# Altium footprint library ICL_connectors_v1.PcbLib: 86 footprints (part 5 of 6)
Each footprint in its own frame and in the unit in brackets; x right, y up, seen from the top. Pads: shape width x height; smd on the part's side, far side on the other; paste and mask are expansions set on the pad; w line width, h text height; cw(c..) or ccw(c..) is an arc to the next point about the centre after c.
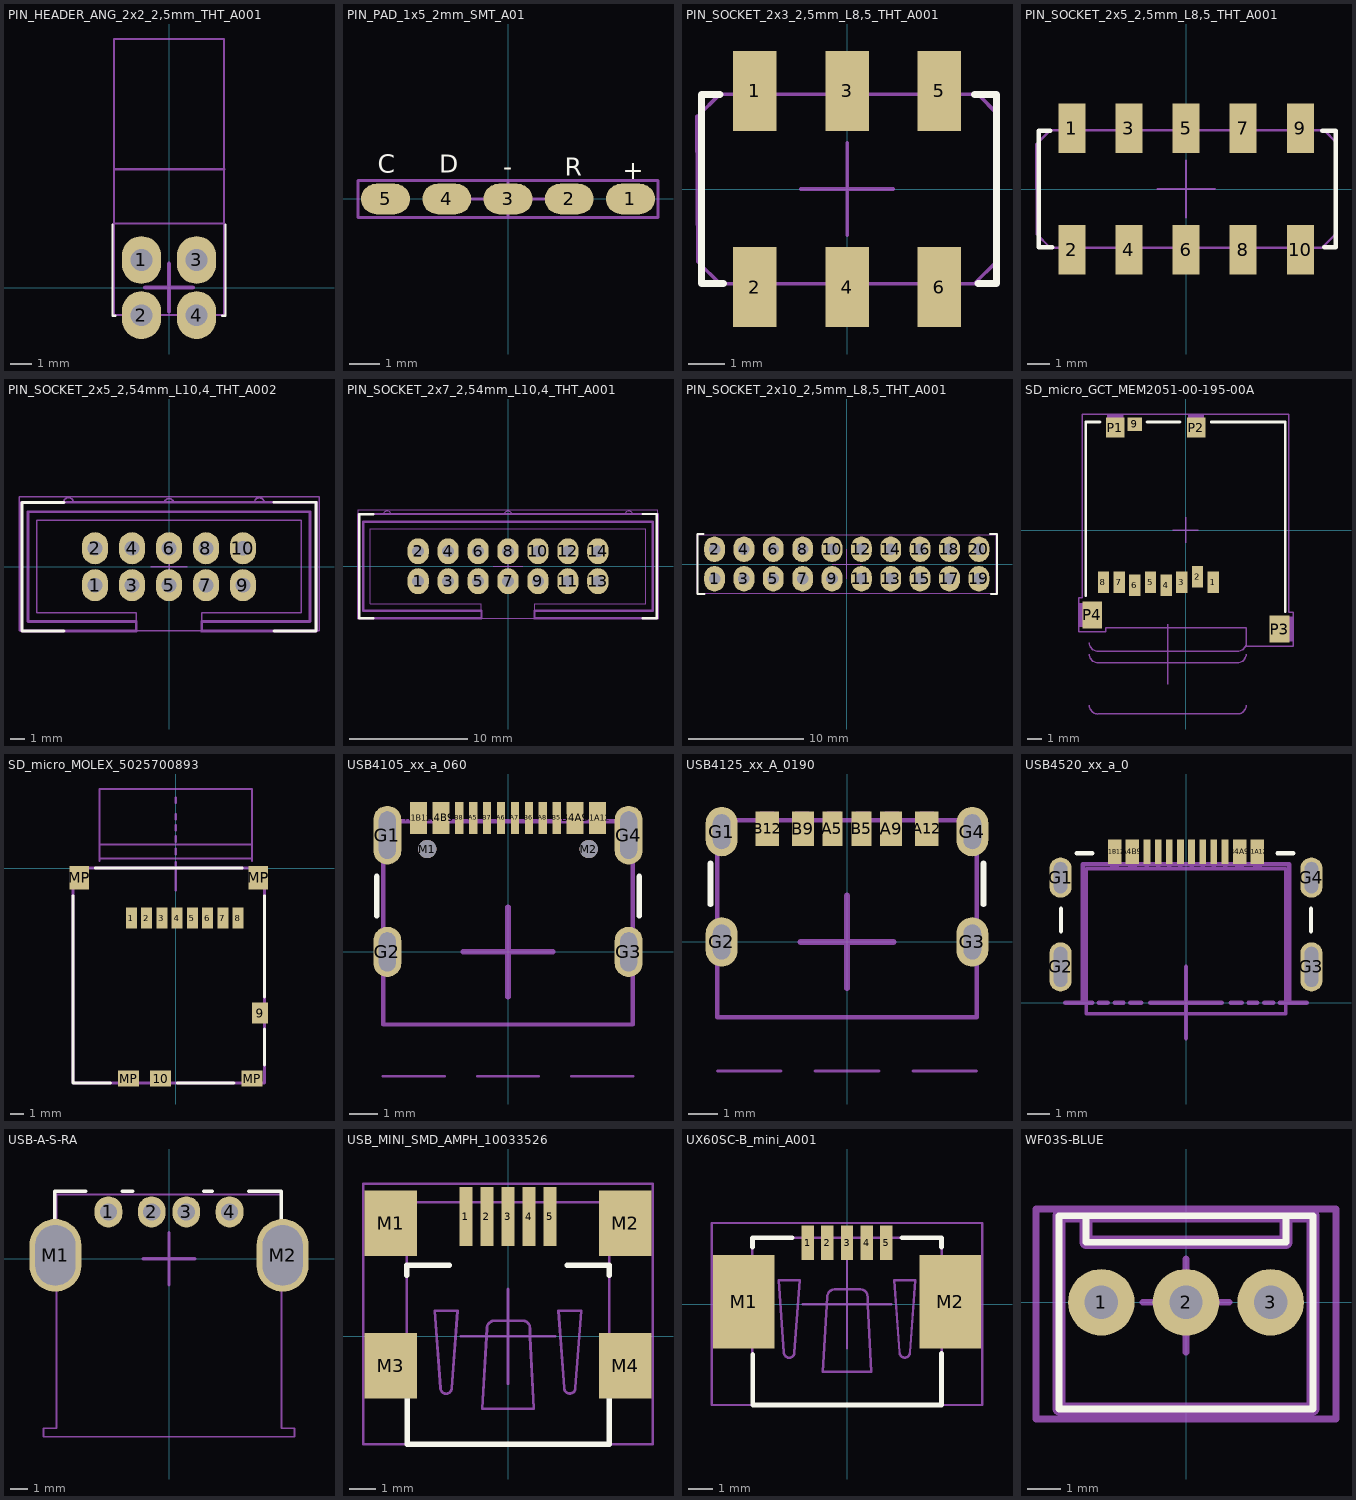
[diagram p4: the footprints below, top view; thin cyan lines are the x and y axes]

## PIN_HEADER_ANG_2x2_2,5mm_THT_A001 [mm]
pads (4):
  oval 1.8x2.2 hole 1 paste-1: 1(-1.27,1.27) 2(-1.27,-1.27) 3(1.27,1.27) 4(1.27,-1.27)
Top Overlay:
  lines w0.1: -2.6,2.9 -2.6,-1.3 -2.467,-1.3 ; 2.446,-1.298 2.446,-1.3 2.6,-1.3 2.6,2.9
Top M15-16_SORG:
  lines w0.2: -1.1,0 0,0 ; 0,-1.1 0,0 ; 0,1.1 0,0 ; 1.1,0 0,0
Top M17-18_TDES:
  text "'.Designator'" at -5.665,2.983 h1
Top M19-20_TMOT:
  lines w0.1: -2.551,2.95 2.537,2.95 ; -2.533,5.45 2.555,5.45 ; -2.54,-1.27 2.54,-1.27 2.54,11.45 -2.54,11.45 -2.54,-1.27
3D body "61300421021_2x2_2_54.stp": height 5.09, standoff -2.99, extent -2.545,-1.59 2.535,11.31

## PIN_PAD_1x5_2mm_SMT_A01 [mm] "programing pcb pad"
pads (5):
  oval 1.6x1 smd paste-2 mask+0.02: 1(4,0) 2(2,0) 3(0,0) 4(-2,0) 5(-4,0)
Top Overlay:
  text "+" at 3.75,0.65 h0.6
  text "-" at -0.15,0.75 h0.6
  text "R" at 1.85,0.75 h0.6
  text "D" at -2.25,0.85 h0.6
  text "C" at -4.25,0.85 h0.6
Top Solder:
  text "R" at 1.755,-1.429 h0.6
  text "-" at -0.2,-1.394 h0.6
  text "D" at -2.2,-1.394 h0.6
  text "C" at -4.245,-1.429 h0.6
  text "+" at 3.8,-1.4 h0.4
Top M11-12_SMOT:
  lines w0.1: -4.9,-0.6 4.9,-0.6 4.9,0.6 -4.9,0.6 -4.9,-0.6
Top M13-14_SDES:
  text "'.Designator'" at -2.832,0.892 h0.5
Top M15-16_SORG:
  lines w0.1: -1.27,0 0,0 ; 0,-0.6 0,0 ; 0,0.6 0,0 ; 1.27,0 0,0
3D body: height 0.2, standoff 0, extent -4.4,-0.4 -3.6,0.4
3D body: height 0.2, standoff 0, extent -2.4,-0.4 -1.6,0.4
3D body: height 0.2, standoff 0, extent -0.4,-0.4 0.4,0.4
3D body: height 0.2, standoff 0, extent 1.6,-0.4 2.4,0.4
3D body: height 0.2, standoff 0, extent 3.6,-0.4 4.4,0.4

## PIN_SOCKET_2x3_2,5mm_L8,5_THT_A001 [mm]
pads (6):
  rect 1.2x2.2 smd paste-1: 1(-2.54,2.7) 2(-2.54,-2.7) 3(0,2.7) 4(0,-2.7) 5(2.54,2.7) 6(2.54,-2.7)
Top Overlay:
  lines w0.2: -3.51,2.6 -4.01,2.6 -4.01,-2.6 -3.41,-2.6 ; 3.51,2.6 4.11,2.6 4.11,-2.6 3.61,-2.6
Top M11-12_SMOT:
  lines w0.1: -4.133,2 -4.11,-2 -3.502,-2.608 ; -4.11,2 -3.512,2.602 ; -3.515,2.608 3.61,2.608 ; -3.51,-2.608 3.502,-2.608 4.111,-1.999 ; 3.61,2.6 4.125,2.081 4.107,-2
Top M13-14_SDES:
  text "'.Designator'" at -5.665,-0.417 h1
Top M15-16_SORG:
  lines w0.1: -1.27,0 0,0 ; 0,-1.27 0,0 ; 0,1.27 0,0 ; 1.27,0 0,0
3D body "61030621821 (rev1).stp": height 7.46, standoff 0.01, extent -4.06,-3.35 4.06,3.35

## PIN_SOCKET_2x5_2,5mm_L8,5_THT_A001 [mm]
pads (10):
  rect 1.2x2.2 smd paste-1: 1(-5.08,2.7) 2(-5.08,-2.7) 3(-2.54,2.7) 4(-2.54,-2.7) 5(0,2.7) 6(0,-2.7) 7(2.54,2.7) 8(2.54,-2.7) 9(5.08,2.7) 10(5.08,-2.7)
Top Overlay:
  lines w0.2: -6.05,2.6 -6.55,2.6 -6.55,-2.6 -5.95,-2.6 ; 6.05,2.6 6.65,2.6 6.65,-2.6 6.15,-2.6
Top M11-12_SMOT:
  lines w0.1: -6.673,2 -6.65,-2 -6.042,-2.608 6.042,-2.608 6.651,-1.999 6.658,-0.59 ; -6.65,2 -6.052,2.602 ; -6.052,2.608 6.15,2.608 ; 6.15,2.6 6.665,2.081 6.653,-0.59
Top M13-14_SDES:
  text "'.Designator'" at -5.665,-0.417 h1
Top M15-16_SORG:
  lines w0.1: -1.27,0 0,0 ; 0,-1.27 0,0 ; 0,1.27 0,0 ; 1.27,0 0,0
3D body "61001021821_socket_2_54_2x5_SMT.stp": height 7.46, standoff 0.01, extent -6.6,-3.35 6.6,3.35

## PIN_SOCKET_2x5_2,54mm_L10,4_THT_A002 [mm]
pads (10):
  oval 1.8x2.2 hole 1 paste-1: 1(-5.08,-1.27) 2(-5.08,1.27) 3(-2.54,-1.27) 4(-2.54,1.27) 5(0,-1.27) 6(0,1.27) 7(2.54,-1.27) 8(2.54,1.27) 9(5.08,-1.27) 10(5.08,1.27)
Top Overlay:
  lines w0.2: -7.2,-4.425 -10.1,-4.425 -10.1,4.4 -7.2,4.4 ; 7.2,-4.4 10.1,-4.4 10.1,4.425 7.2,4.425
Top M15-16_SORG:
  lines w0.1: -1.27,0 0,0 ; 0,-1.27 0,0 ; 0,1.27 0,0 ; 1.27,0 0,0 ; -10.3,-4.4 10.3,-4.4 10.3,4.8 -10.3,4.8 -10.3,-4.4
Top M17-18_TDES:
  text "'.Designator'" at -5.665,5.583 h1
Top M19-20_TMOT:
  lines w0.1: -7.225,4.486 cw(c-6.9,4.4) -6.575,4.486 ; -2.25,-3.775 -2.25,-3.175 -9.07,-3.175 -9.07,3.175 9.07,3.175 9.07,-3.175 2.25,-3.175 2.25,-3.775 ; -0.325,4.425 cw(c0,4.339) 0.325,4.425 ; 5.875,4.486 cw(c6.2,4.4) 6.525,4.486
  lines w0.2: 2.25,-4.425 10.12,-4.425 10.12,4.425 -10.12,4.425 -10.12,-4.425 -2.25,-4.425 -2.25,-3.775 -9.67,-3.775 -9.67,3.775 9.67,3.775 9.67,-3.775 2.25,-3.775 2.25,-4.425 ; 2.25,-4.425 2.25,-4.425
3D body "61201021621 (rev1).stp": height 9.11, standoff -2.99, extent -10.18,-4.425 10.18,4.75

## PIN_SOCKET_2x7_2,54mm_L10,4_THT_A001 [mm]
pads (14):
  oval 1.8x2.2 hole 1 paste-1: 1(-7.62,-1.27) 2(-7.62,1.27) 3(-5.08,-1.27) 4(-5.08,1.27) 5(-2.54,-1.27) 6(-2.54,1.27) 7(0,-1.27) 8(0,1.27) 9(2.54,-1.27) 10(2.54,1.27) 11(5.08,-1.27) 12(5.08,1.27) 13(7.62,-1.27) 14(7.62,1.27)
Top Overlay:
  lines w0.2: -11.4,-4.425 -12.6,-4.425 -12.6,4.4 -11.4,4.4 ; 11.4,-4.4 12.6,-4.4 12.6,4.425 11.4,4.425
Top M15-16_SORG:
  lines w0.1: -1.27,0 0,0 ; 0,-1.27 0,0 ; 0,1.27 0,0 ; 1.27,0 0,0 ; -12.7,-4.4 12.7,-4.4 12.7,4.8 -12.7,4.8 -12.7,-4.4
Top M17-18_TDES:
  text "'.Designator'" at -5.665,5.583 h1
Top M19-20_TMOT:
  lines w0.1: -10.57,4.425 cw(c-10.245,4.339) -9.92,4.425 ; -2.25,-3.775 -2.25,-3.175 -11.67,-3.175 -11.67,3.175 11.67,3.175 11.67,-3.175 2.25,-3.175 2.25,-3.775 ; -0.325,4.425 cw(c0,4.339) 0.325,4.425 ; 9.92,4.425 cw(c10.245,4.339) 10.57,4.425
  lines w0.2: -12.72,4.425 -12.72,-4.425 -2.25,-4.425 -2.25,-3.775 -12.27,-3.775 -12.27,3.775 12.27,3.775 12.27,-3.775 2.25,-3.775 2.25,-4.425 ; -12.72,4.425 -12.72,4.425 ; -12.72,4.425 12.72,4.425 12.72,-4.425 2.25,-4.425 ; 2.25,-4.425 2.25,-4.425
3D body "61201421621 (rev1).stp": height 9.11, standoff -2.99, extent -12.72,-4.425 12.72,4.75

## PIN_SOCKET_2x10_2,5mm_L8,5_THT_A001 [mm]
pads (20):
  oval 1.8x2.2 hole 1 paste-1: 1(-11.43,-1.27) 2(-11.43,1.27) 3(-8.89,-1.27) 4(-8.89,1.27) 5(-6.35,-1.27) 6(-6.35,1.27) 7(-3.81,-1.27) 8(-3.81,1.27) 9(-1.27,-1.27) 10(-1.27,1.27) 11(1.27,-1.27) 12(1.27,1.27) 13(3.81,-1.27) 14(3.81,1.27) 15(6.35,-1.27) 16(6.35,1.27) 17(8.89,-1.27) 18(8.89,1.27) 19(11.43,-1.27) 20(11.43,1.27)
Top Overlay:
  lines w0.2: -12.4,2.6 -12.9,2.6 -12.9,-2.6 -12.3,-2.6 ; 12.4,2.6 13,2.6 13,-2.6 12.5,-2.6
Top M15-16_SORG:
  lines w0.1: -1.27,0 0,0 ; 0,-1.27 0,0 ; 0,1.27 0,0 ; 1.27,0 0,0
Top M17-18_TDES:
  text "'.Designator'" at -6.265,3.283 h1
Top M19-20_TMOT:
  lines w0.1: -12.95,-2.54 12.95,-2.54 12.95,2.54 -12.95,2.54 -12.95,-2.54
3D body "61302021821_PinHeaderSocket_2x10_2_54_v1.stp": height 8.41, standoff -3.14, extent -12.95,-2.54 12.95,2.54

## SD_micro_GCT_MEM2051-00-195-00A [mm] "MOLEX : 502570-0893"
pads (13):
  rect 0.8x1.5 smd: 1(1.94,-3.66) 2(0.84,-3.26) 3(-0.26,-3.66) 4(-1.36,-3.86) 5(-2.46,-3.66) 6(-3.56,-3.86) 7(-4.66,-3.66) 8(-5.76,-3.66)
  rect 1x0.95 smd: 9(-3.56,7.425)
  rect 1.3x1.4 smd: P1(-4.95,7.2) P2(0.75,7.2)
  rect 1.4x1.9 smd: P3(6.6,-6.95) P4(-6.55,-5.95)
Top Overlay:
  lines w0.2: -7,-4.6 -7,7.6 -6,7.6 ; -2.7,7.6 -0.4,7.6 ; 1.8,7.6 7,7.6 7,-5.7
Top M11-12_SMOT:
  rectangle: 1.6,-4.3 2.27,-3
  rectangle: 0.5,-3.9 1.17,-2.6
  rectangle: -0.6,-4.3 0.07,-3
  rectangle: -1.7,-4.5 -1.03,-3.2
  rectangle: -2.8,-4.3 -2.13,-3
  rectangle: -3.9,-4.5 -3.23,-3.2
  rectangle: -5,-4.3 -4.33,-3
  rectangle: -4.027,7 -3.128,7.851
  rectangle: 0.186,6.6 1.308,8.122
  rectangle: -6.1,-4.3 -5.43,-3
  rectangle: 6,-7.8 7.562,-6.073
  rectangle: -5.5,6.6 -4.351,8.14
  rectangle: -7.5,-6.8 -6,-5.1
  lines w0.1: -6.751,-12.305 ccw(c-6.151,-12.305) -6.151,-12.905 ; -6.751,-8.705 ccw(c-6.151,-8.705) -6.151,-9.305 ; -6.751,-7.905 ccw(c-6.151,-7.905) -6.151,-8.505 ; -6.151,-12.9 3.65,-12.9 ; -6.151,-9.3 3.65,-9.3 ; -6.151,-8.5 3.65,-8.5 ; -1.25,-10.8 -1.25,-6.6 ; 3.65,-12.901 ccw(c3.65,-12.301) 4.25,-12.301 ; 3.65,-9.301 ccw(c3.65,-8.701) 4.25,-8.701 ; 3.65,-8.501 ccw(c3.65,-7.901) 4.25,-7.901 ; -7.5,-7.15 -7.5,-4.75 -7.25,-4.75 -7.25,8.15 7.25,8.15 7.25,-5.75 7.55,-5.75 7.55,-8.15 4.25,-8.15 4.25,-6.85 -5.6,-6.85 -5.6,-7.15 -7.5,-7.15
Top M13-14_SDES:
  text "'.Designator'" at -5.765,1.283 h1
Top M15-16_SORG:
  lines w0.1: -0.9,0 0,0 ; 0,-0.9 0,0 ; 0,0.9 0,0 ; 0.9,0 0,0
3D body "step_temp.STEP": height 1.95, standoff 0, extent -7.05,-7.6 7.05,7.7

## SD_micro_MOLEX_5025700893 [mm] "MOLEX : 502570-0893"
pads (14):
  rect 0.8x1.5 smd: 1(-3.2,-3.6) 2(-2.1,-3.6) 3(-1,-3.6) 4(0.1,-3.6) 5(1.2,-3.6) 6(2.3,-3.6) 7(3.4,-3.6) 8(4.5,-3.6)
  rect 1.15x1.5 smd: 9(6.075,-10.45)
  rect 1.5x1.15 smd: 10(-1.1,-15.175) MP(-3.4,-15.175) MP(5.5,-15.175)
  rect 1.4x1.7 smd: MP(-6.95,-0.7) MP(5.95,-0.7)
Top Overlay:
  lines w0.2: -7.4,-2 -7.4,-15.5 -4.7,-15.5 ; -5.8,0 4.8,0 ; 0.1,-15.5 4.2,-15.5 ; 6.4,-14.2 6.4,-11.6 ; 6.4,-9.3 6.4,-2
Top M11-12_SMOT:
  rectangle: -1.7,-15.7 -0.5,-14.8
  rectangle: -4,-15.7 -2.8,-14.8
  rectangle: 5,-15.7 6.2,-14.8
  rectangle: 5.6,-11.1 6.6,-9.8
  rectangle: 5.4,-1.4 6.6,-0.1
  rectangle: -7.6,-1.4 -6.3,-0.1
  lines w0.152: -5.5,0.5 -5.5,5.7 5.5,5.7 5.5,0.5 ; -5.5,0.7 5.5,0.7 ; -5.5,1.7 5.5,1.7 ; 0,1 0,1.4 ; 0,1.9 0,2.3 ; 0,2.7 0,3.1 ; 0,3.5 0,3.9 ; 0,4.7 0,5.1
  lines w0.2: -7.4,-15.5 6.4,-15.5 6.4,0 -7.4,0 -7.4,-15.5
Top M13-14_SDES:
  text "'.Designator'" at -6.165,-7.917 h1
Top M15-16_SORG:
  lines w0.2: -1.6,0 0,0 ; 0,-1.6 0,0 ; 0,0.4 0,0 ; 1.6,0 0,0
Bottom M15-16_SORG:
  lines w0.2: -7.4,-2 -7.4,-15.5 -4.7,-15.5 ; -5.8,0 4.8,0 ; 0.1,-15.5 4.2,-15.5 ; 6.4,-14.2 6.4,-11.6 ; 6.4,-9.3 6.4,-2
3D body "SM_Micro_5025700893.STEP": height 1.8, standoff 0, extent -7.4,-15.5 6.4,0

## USB4105_xx_a_060 [mm] "usb C SMD/THT top"
pads (18):
  rect 0.6x1.15 smd: A1B12(-3.2,4.8) A4B9(-2.4,4.8) B1A12(3.2,4.8) B4A9(2.4,4.8)
  rect 0.3x1.15 smd: A5(-1.25,4.8) A6(-0.25,4.8) A7(0.25,4.8) A8(1.25,4.8) B5(1.75,4.8) B6(0.75,4.8) B7(-0.75,4.8) B8(-1.75,4.8)
  oval 1x2.1 hole 0.6 slot 1.7 at 90 deg: G1(-4.32,4.18) G4(4.32,4.18)
  oval 1x1.8 hole 0.6 slot 1.4 at 90 deg: G2(-4.32,0) G3(4.32,0)
  round 0.65 hole 0.65 unplated: M1(-2.89,3.68) M2(2.89,3.68)
Top Overlay:
  lines w0.2: -4.7,1.3 -4.7,2.7 ; 4.7,1.3 4.7,2.7
Top M11-12_SMOT:
  rectangle: -3.4,4.7 -3,5.1
  rectangle: 2.2,4.7 2.6,5.1
  rectangle: 3,4.7 3.4,5.1
  rectangle: -2.6,4.7 -2.2,5.1
  rectangle: -1.85,4.7 -1.65,5.1
  rectangle: -1.35,4.7 -1.15,5.1
  rectangle: -0.85,4.7 -0.65,5.1
  rectangle: -0.35,4.7 -0.15,5.1
  rectangle: 0.15,4.7 0.35,5.1
  rectangle: 0.65,4.7 0.85,5.1
  rectangle: 1.15,4.7 1.35,5.1
  rectangle: 1.65,4.7 1.85,5.1
  lines w0.1: -4.47,-4.45 -2.27,-4.45 ; -1.1,-4.45 1.1,-4.45 ; 2.27,-4.45 4.47,-4.45
  lines w0.152: -4.47,-2.6 4.47,-2.6 4.47,4.68 -4.47,4.68 -4.47,-2.6
Top M13-14_SDES:
  text "'.Designator'" at -5.665,1.583 h1
Top M15-16_SORG:
  lines w0.2: -1.6,0 0,0 ; 0,-1.6 0,0 ; 0,1.6 0,0 ; 1.6,0 0,0
3D body "usb4105-xx-a-060.step": height 3.27, standoff -0.61, extent -4.47,-2.6 4.47,5.1

## USB4125_xx_A_0190 [mm] "usb C SMD/THT top power only"
pads (10):
  rect 0.7x1.2 smd: A5(-0.5,3.9) B5(0.5,3.9)
  rect 0.76x1.2 smd: A9(1.52,3.9) B9(-1.52,3.9)
  rect 0.8x1.2 smd: A12(2.75,3.9) B12(-2.75,3.9)
  oval 1.1x1.7 hole 0.6 slot 1.2 at 90 deg: G1(-4.32,3.8) G2(-4.32,0) G3(4.32,0) G4(4.32,3.8)
Top Overlay:
  lines w0.2: -4.7,1.3 -4.7,2.7 ; 4.7,1.3 4.7,2.7
Top M11-12_SMOT:
  rectangle: 0.3,3.5 0.8,4.5
  rectangle: -0.7,3.5 -0.2,4.5
  rectangle: -1.8,3.5 -1.3,4.5
  rectangle: -3,3.5 -2.5,4.5
  rectangle: 1.3,3.5 1.8,4.5
  rectangle: 2.5,3.5 3,4.5
  lines w0.152: -4.47,-2.6 -4.47,4.2 4.47,4.2 4.47,-2.6 -4.47,-2.6
Top M13-14_SDES:
  text "'.Designator'" at -5.665,1.583 h1
Top M15-16_SORG:
  lines w0.1: -4.47,-4.45 -2.27,-4.45 ; -1.1,-4.45 1.1,-4.45 ; 2.27,-4.45 4.47,-4.45
  lines w0.2: -1.6,0 0,0 ; 0,-1.6 0,0 ; 0,1.6 0,0 ; 1.6,0 0,0
3D body "USB4125-GF-A-0190.stp": height 3.27, standoff -1.89, extent -4.47,-2.6 4.47,4.3

## USB4520_xx_a_0 [mm] "usb C SMD/THT top"
pads (16):
  rect 0.6x1.1 smd: A1B12(-3.2,6.75) A4B9(-2.4,6.75) B1A12(3.2,6.75) B4A9(2.4,6.75)
  rect 0.3x1.1 smd: A5(-1.25,6.75) A6(-0.25,6.75) A7(0.25,6.75) A8(1.25,6.75) B5(1.75,6.75) B6(0.75,6.75) B7(-0.75,6.75) B8(-1.75,6.75)
  oval 1x1.8 hole 0.6 slot 1.4 at 90 deg: G1(-5.62,5.6) G4(5.62,5.6)
  oval 1x2.2 hole 0.6 slot 1.8 at 90 deg: G2(-5.62,1.6) G3(5.62,1.6)
Top Overlay:
  lines w0.2: -5.6,3.2 -5.6,4.2 ; -4.9,6.7 -4.2,6.7 ; 4.1,6.7 4.8,6.7 ; 5.6,3.2 5.6,4.2
Top M11-12_SMOT:
  rectangle: -3.4,6 -3,6.7
  rectangle: 2.2,6 2.6,6.7
  rectangle: 3,6 3.4,6.7
  rectangle: -2.6,6 -2.2,6.7
  rectangle: -1.85,6 -1.65,6.7
  rectangle: -1.35,6 -1.15,6.7
  rectangle: -0.85,6 -0.65,6.7
  rectangle: -0.35,6 -0.15,6.7
  rectangle: 0.15,6 0.35,6.7
  rectangle: 0.65,6 0.85,6.7
  rectangle: 1.15,6 1.35,6.7
  rectangle: 1.65,6 1.85,6.7
  lines w0.152: -4.47,-0.5 4.47,-0.5 4.47,6 -4.47,6 -4.47,-0.5
  lines w0.2: -5.4,0 -5,0 ; -4.7,0 -4.2,0 ; -3.9,0 -3.5,0 ; -3.2,0 -2.8,0 ; -2.5,0 -2,0 ; 2,0 2.5,0 ; 2.8,0 3.2,0 ; 3.5,0 3.9,0 ; 4.2,0 4.7,0 ; 5,0 5.4,0
Top M13-14_SDES:
  text "'.Designator'" at -5.765,3.183 h1
Top M15-16_SORG:
  lines w0.2: -1.6,0 0,0 ; 0,-1.6 0,0 ; 0,1.6 0,0 ; 1.6,0 0,0
M30_PCBD:
  lines w0.2: -5.4,0 -4.62,0 -4.62,6.2 4.62,6.2 4.62,0 5.4,0
3D body "usb4520-03-0-a.step": height 1.07, standoff -2.09, extent -5.77,-0.5 5.77,6.7

## USB-A-S-RA [mm] "USB  A Gniazdo THT"
pads (6):
  oval 1.6x1.8 hole 1: 1(-3.5,2.71) 2(-1,2.71) 3(1,2.71) 4(3.5,2.71)
  oval 3x4.2 hole 2.3 slot 3.5 at 90 deg: M1(-6.57,0.2) M2(6.57,0.2)
Top Overlay:
  lines w0.2: -6.6,1.8 -6.6,3.9 -4.8,3.9 ; -2.7,3.9 -2.1,3.9 ; 2,3.9 2.5,3.9 ; 4.6,3.9 6.5,3.9 6.5,1.8
Top M15-16_SORG:
  lines w0.2: -1.5,0 0,0 ; 0,-1.5 0,0 ; 0,1.5 0,0 ; 1.5,0 0,0
Top M17-18_TDES:
  text "'.Designator'" at -5.565,-2.817 h1
Top M19-20_TMOT:
  lines w0.1: -7.25,-10.28 7.25,-10.28 7.25,-9.8 6.5,-9.8 6.5,3.72 -6.5,3.72 -6.5,-9.8 -7.25,-9.8 -7.25,-10.28
3D body "User Library-USB-A-01.step": height 6.96, standoff -4.19, extent -7.9,-9.79 7.9,3.91

## USB_MINI_SMD_AMPH_10033526 [mm] "Amhenol 10033526-N3212MLF USBnini B smd"
pads (9):
  rect 0.5x2.25 smd mask+0: 1(-1.6,4.55) 2(-0.8,4.55) 3(0,4.55) 4(0.8,4.55) 5(1.6,4.55)
  rect 2x2.5 smd mask+0: M1(-4.45,4.3) M2(4.45,4.3) M3(-4.45,-1.12) M4(4.45,-1.12)
Top Overlay:
  lines w0.1: 3.849,2.7 3.85,2.7
  lines w0.2: -3.849,2.321 -3.849,2.7 -2.226,2.7 ; -3.832,-2.05 -3.832,-4.1 3.849,-4.1 3.849,-2.006 ; 2.24,2.7 3.85,2.7 3.849,2.324
Top M11-12_SMOT:
  drawing of 31 lines, arcs and shapes, not listed
Top M15-16_SORG:
  lines w0.1: -1.8,0 0,0 ; 0,-1.8 0,0 ; 0,1.8 0,0 ; 1.8,0 0,0 ; -5.5,-4.1 5.5,-4.1 5.5,5.8 -5.5,5.8 -5.5,-4.1
3D body "10033526-n3212mlfc.STEP": height 3.96, standoff -0.94, extent -4.942,-4.1 4.958,5.225

## UX60SC-B_mini_A001 [mm] "nini B smd"
pads (7):
  rect 0.5x1.4 smd mask+0: 1(-1.6,2.5) 2(-0.8,2.5) 3(0,2.5) 4(0.8,2.5) 5(1.6,2.5)
  rect 2.5x3.8 smd mask+0: M1(-4.2,0.1) M2(4.2,0.1)
Top Overlay:
  lines w0.1: 3.849,2.7 3.85,2.7
  lines w0.2: -3.849,2.321 -3.849,2.7 -2.226,2.7 ; -3.832,-2.05 -3.832,-4.1 3.849,-4.1 3.849,-2.006 ; 2.24,2.7 3.85,2.7 3.849,2.324
Top M11-12_SMOT:
  rectangle: 1.5,2.7 1.7,3
  rectangle: 0.7,2.7 0.9,3
  rectangle: -0.1,2.7 0.1,3
  rectangle: -0.9,2.7 -0.7,3
  rectangle: -1.7,2.7 -1.5,3
  region: -3.845,-0.3 -4.7,-0.3 -4.74,-0.3 -4.813,-0.33 -4.87,-0.387 -4.9,-0.46 -4.9,-0.5 -4.9,-1.1 -4.9,-1.14 -4.87,-1.213 -4.813,-1.27 -4.74,-1.3 -4.7,-1.3 -3.845,-1.3
  region: -3.845,1.5 -4.7,1.5 -4.74,1.5 -4.813,1.47 -4.87,1.413 -4.9,1.34 -4.9,1.3 -4.9,0.7 -4.9,0.66 -4.87,0.587 -4.813,0.53 -4.74,0.5 -4.7,0.5 -3.845,0.5
  region: 3.845,0.5 4.7,0.5 4.74,0.5 4.813,0.53 4.87,0.587 4.9,0.66 4.9,0.7 4.9,1.3 4.9,1.34 4.87,1.413 4.813,1.47 4.74,1.5 4.7,1.5 3.845,1.5
  region: 3.845,-1.3 4.7,-1.3 4.74,-1.3 4.813,-1.27 4.87,-1.213 4.9,-1.14 4.9,-1.1 4.9,-0.5 4.9,-0.46 4.87,-0.387 4.813,-0.33 4.74,-0.3 4.7,-0.3 3.845,-0.3
  lines w0.1: -3.85,-4.1 -3.85,2.7 3.85,2.7 3.85,-2.4 3.85,-4.1 -3.85,-4.1 ; -2.779,0.976 -2.566,-1.966 ccw(c-2.352,-1.966) -2.139,-1.966 -1.921,0.976 -2.779,0.976 ; -0.978,-2.757 0.978,-2.757 0.836,-0.016 0.836,0.312 ccw(c0.548,0.312) 0.548,0.6 0,0.6 -0.5,0.6 ccw(c-0.5,0.3) -0.8,0.3 -0.978,-2.757 ; 1.921,0.976 2.134,-1.958 ccw(c2.348,-1.958) 2.562,-1.958 2.779,0.976 1.921,0.976
Top M15-16_SORG:
  lines w0.1: -1.8,0 0,0 ; 0,-1.8 0,0 ; 0,1.8 0,0 ; 1.8,0 0,0 ; -5.5,-4.1 5.5,-4.1 5.5,3.3 -5.5,3.3 -5.5,-4.1
3D body "UX60SC-MB-5ST.STEP": height 3.96, standoff 0.01, extent -4.9,-4.1 4.9,2.9

## WF03S-BLUE [mm] "2.54mm  3p BLUE"
pads (3):
  round 2 hole 1: 1(-2.54,0) 2(0,0) 3(2.54,0)
Top Overlay:
  lines w0.2: -3,2.6 -3,1.8 3,1.8 3,2.6 ; -3.81,-3.2 3.81,-3.2 3.81,2.6 -3.81,2.6 -3.81,-3.2
Top M15-16_SORG:
  lines w0.2: -1.3,0 0,0 ; 0,-1.5 0,0 ; 0,1.3 0,0 ; 1.3,0 0,0 ; -4.5,-3.5 -4.5,2.8 4.5,2.8 4.5,-3.5 -4.5,-3.5
Top M17-18_TDES:
  text "'.Designator'" at -5.565,-2.417 h1
Top M19-20_TMOT:
  circle w0.6: c-2.54,0 r0.26
  circle w0.6: c0,0 r0.26
  circle w0.6: c2.54,0 r0.26
  lines w0.4: -3,2.6 -3,1.8 3,1.8 3,2.6 ; -3.81,-3.2 -3.81,2.6 3.81,2.6 3.81,-3.2 -3.81,-3.2
3D body "WF03S_BLUE.STEP": height 11.51, standoff -3.39, extent -3.81,-3.2 3.81,2.6